# Altium footprint library AMDC.PcbLib: 96 footprints (part 3 of 6)
Each footprint in its own frame and in the unit in brackets; x right, y up, seen from the top. Pads: shape width x height; smd on the part's side, far side on the other; paste and mask are expansions set on the pad; w line width, h text height; cw(c..) or ccw(c..) is an arc to the next point about the centre after c.
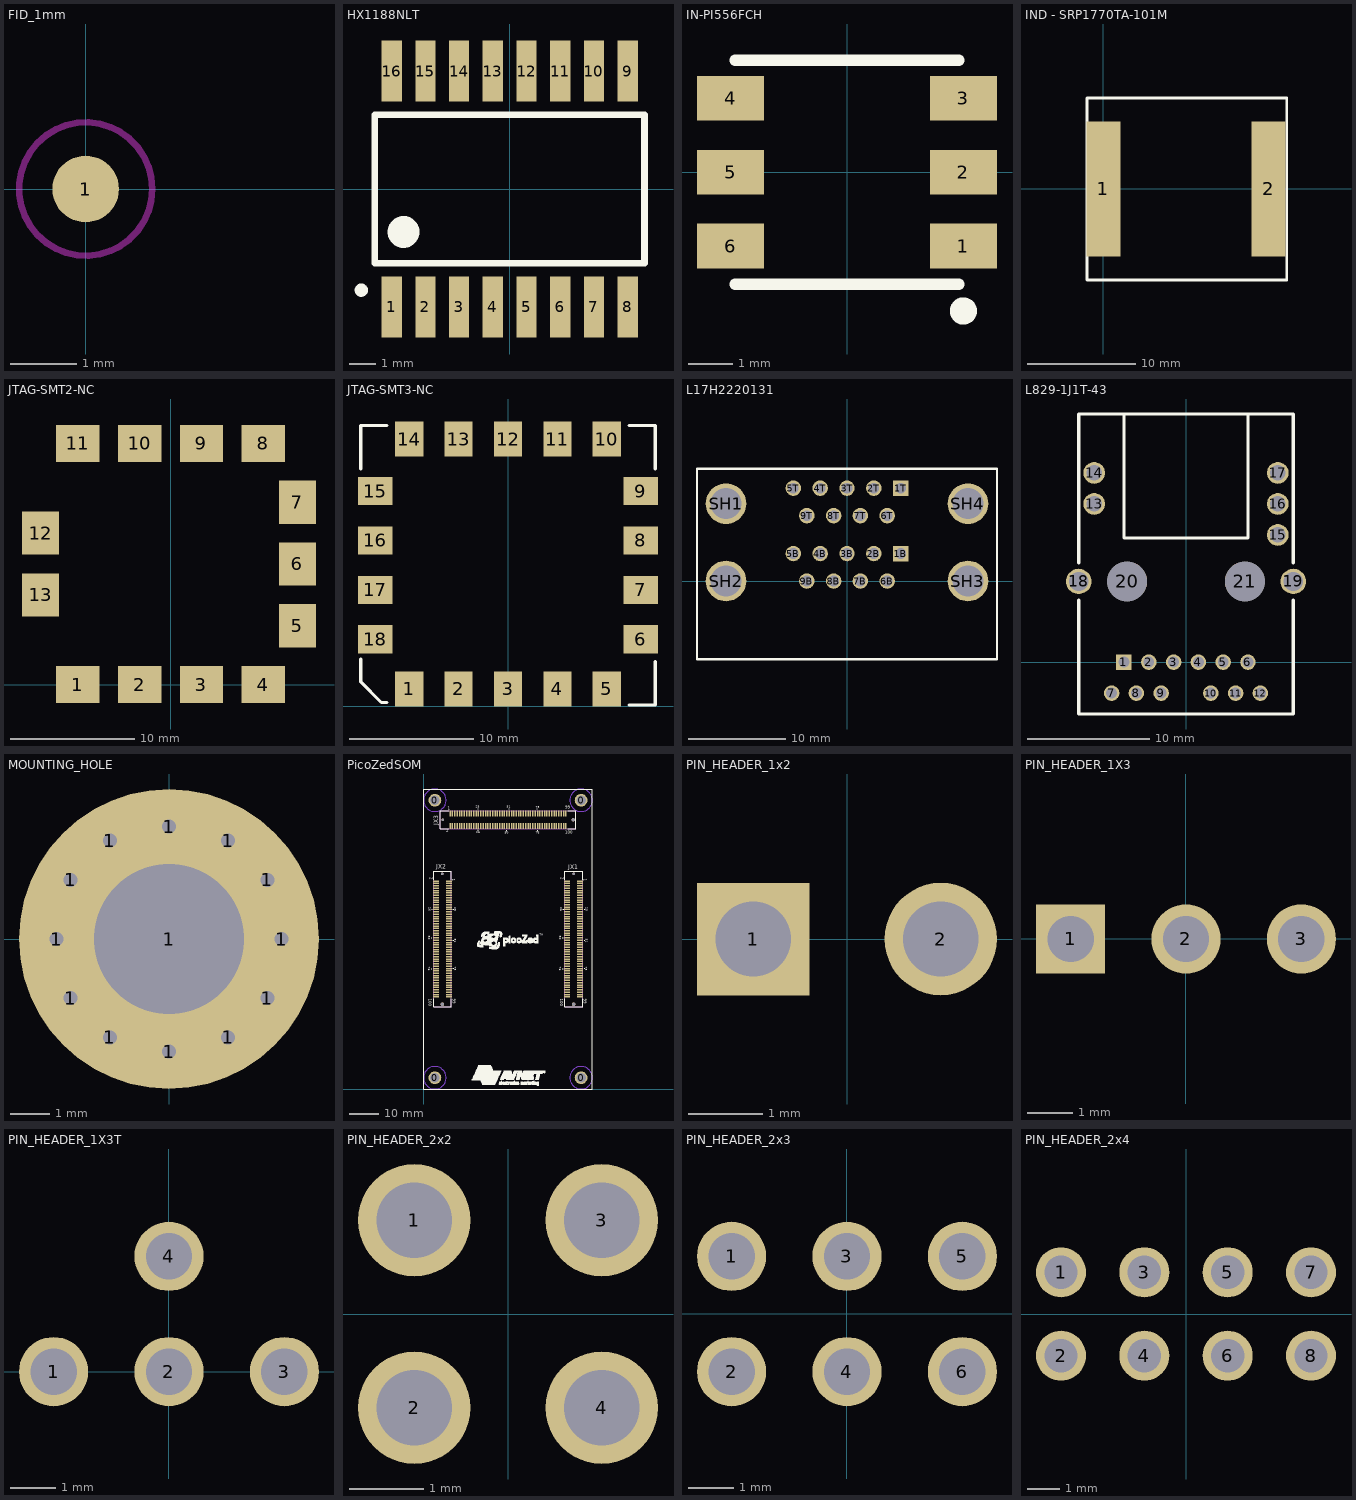
[diagram p2: the footprints below, top view; thin cyan lines are the x and y axes]

## FID_1mm [mm]
pads (1):
  round 1 smd mask+0.5: 1(0,0)
Top Layer:
  pour cut-out: 0,0
  pour cut-out: 3.5,0.5
Top Layer keep-out:
  circle w0.1: c0,0 r1

## HX1188NLT [mil] "XFRMR MAGNETIC 1PORT 1:1 10/100"
height 236
pads (16):
  rect 30x90 smd: 1(-175,-175) 2(-125,-175) 3(-75,-175) 4(-25,-175) 5(25,-175) 6(75,-175) 7(125,-175) 8(175,-175) 9(175,175) 10(125,175) 11(75,175) 12(25,175) 13(-25,175) 14(-75,175) 15(-125,175) 16(-175,175)
Top Overlay:
  circle w9.84: c-220,-150 r4.92
  circle w23.62: c-157.48,-63.62 r11.81
  lines w10: -200,-110 200,-110 200,110 -200,110 -200,-110
3D body "HX1188NL_3D.STEP": height 235, standoff 0, extent -250,-181.06 250,188.93

## IN-PI556FCH [mm] "LED RGB 5050 SMD"
pads (6):
  rect 1.5x1 smd: 1(2.6,-1.65) 2(2.6,0) 3(2.6,1.65) 4(-2.6,1.65) 5(-2.6,0) 6(-2.6,-1.65)
Top Overlay:
  circle w0.305: c2.6,-3.1 r0.152
  lines w0.254: -2.5,-2.5 2.5,-2.5 ; -2.5,2.5 2.5,2.5
3D body "APA102C.STEP": height 1.55, standoff 0, extent -2.75,-2.5 2.75,2.5

## IND - SRP1770TA-101M [mm] "FIXED IND 100UH 5.3A 118 MOHM"
pads (2):
  rect 3.15x12.5 smd: 1(0,0) 2(15.35,0)
Top Overlay:
  lines w0.254: -1.524,-8.45 17.018,-8.45 17.018,8.45 -1.524,8.45 -1.524,-8.382
3D body "SRP1770TA.stp": height 6.81, standoff 0, extent -1.27,-8.45 16.63,8.45

## JTAG-SMT2-NC [mm]
pads (13):
  rect 3.5x3 smd: 1(-7.5,0) 2(-2.5,0) 3(2.5,0) 4(7.5,0) 8(7.5,19.5) 9(2.5,19.5) 10(-2.5,19.5) 11(-7.5,19.5)
  rect 3x3.5 smd: 5(10.25,4.75) 6(10.25,9.75) 7(10.25,14.75) 12(-10.5,12.25) 13(-10.5,7.25)
3D body "SMT2-NC_1_0.stp": height 2.7, standoff 0, extent -11.25,-1 11.5,20.5

## JTAG-SMT3-NC [mm]
pads (18):
  rect 2.3x2.8 smd: 1(-8,1.4) 2(-4,1.4) 3(0,1.4) 4(4,1.4) 5(8,1.4) 10(8,21.6) 11(4,21.6) 12(0,21.6) 13(-4,21.6) 14(-8,21.6)
  rect 2.8x2.3 smd: 6(10.725,5.4) 7(10.725,9.4) 8(10.725,13.4) 9(10.725,17.4) 15(-10.725,17.4) 16(-10.725,13.4) 17(-10.725,9.4) 18(-10.725,5.4)
Top Overlay:
  lines w0.254: -11.9,3.8 -11.9,1.969 -10.231,0.3 -9.8,0.3 ; -11.9,19.2 -11.9,22.7 -9.8,22.7 ; 9.8,0.1 11.9,0.1 11.9,3.6 ; 9.8,22.7 11.9,22.7 11.9,19.2
3D body "DIGILENT_JTAG-SMT3.STEP": height 2.52, standoff 0.02, extent -11.331,0.685 11.419,22.185

## L17H2220131 [mm] "CONN D-SUB RCPT 9POS R/A SLDR"
pads (22):
  rect 1.6x1.6 hole 1.1: 1B(5.54,2.84) 1T(5.54,9.6)
  round 1.6 hole 1.1: 2B(2.77,2.84) 2T(2.77,9.6) 3B(0,2.84) 3T(0,9.6) 4B(-2.77,2.84) 4T(-2.77,9.6) 5B(-5.54,2.84) 5T(-5.54,9.6) 6B(4.155,0) 6T(4.155,6.76) 7B(1.385,0) 7T(1.385,6.76) 8B(-1.385,0) 8T(-1.385,6.76) 9B(-4.155,0) 9T(-4.155,6.76)
  round 4.2 hole 3.2: SH1(-12.5,8) SH2(-12.5,0) SH3(12.5,0) SH4(12.5,8)
Top Overlay:
  lines w0.254: -15.5,-8.08 -15.5,11.6 15.5,11.6 15.5,-8.08 -15.5,-8.08
3D body "L17H2220131--3DModel-STEP-56544.STEP": height 31.67, standoff -3.63, extent -15.405,-13.8 15.405,11.6

## L829-1J1T-43 [mil] "CONN MAGJACK 1PORT 1000 BASE-T"
height 440
pads (21):
  rect 50x50 hole 35.04: 1(-200,0)
  round 50 hole 35.04: 2(-120.08,0) 3(-40.08,0) 4(40,0) 5(119.92,0) 6(199.92,0) 7(-240,-100) 8(-160,-100) 9(-80,-100) 10(80,-100) 11(160,-100) 12(240,-100)
  round 70 hole 50: 13(-296,510) 14(-296,610) 15(296,410) 16(296,510) 17(296,610)
  round 82 hole 62: 18(-346,260) 19(346,260)
  round 127.95 hole 127.95: 20(-190,260) 21(190,260)
Top Overlay:
  pour cut-out: -80,400
  lines w10: -346,200 -346,-167.44 346,-167.44 346,200 ; -346,320 -346,800 -173,800 73,800 346,800 346,320 ; -200,800 -200,400 200,400 200,800
3D body "BEL FUSE L829-1J1T-43-1.step": height 493.47, standoff -151.51, extent -400.55,-167.44 400.55,799.56

## MOUNTING_HOLE [mil]
pads (13):
  round 30 hole 14: 1(-112.5,0) 1(-98.43,-59.06) 1(-98.43,59.06) 1(-59.06,-98.43) 1(-59.06,98.43) 1(0,-112.5) 1(0,112.5) 1(59.06,-98.43) 1(59.06,98.43) 1(98.43,-59.06) 1(98.43,59.06) 1(112.5,0)
  round 300 hole 150: 1(0,0)

## PicoZedSOM [mil] "PicoZed SOM Footprint"
pads (310):
  round 170 hole 125: 0(150,150) 0(150,3850) 0(2100,150) 0(2100,3850)
  round 45.98 hole 47.99 unplated: 0(250.5,1130) 0(1995,3590) 0(2000.5,1130)
  round 30 hole 32.01 unplated: 0(250.5,2870) 0(255,3590) 0(2000.5,2870)
  rect 80x20 smd: JX1-1(2087.11,2771.65) JX1-2(1913.89,2771.65) JX1-3(2087.11,2740.16) JX1-4(1913.89,2740.16) JX1-5(2087.11,2708.66) JX1-6(1913.89,2708.66) JX1-7(2087.11,2677.17) JX1-8(1913.89,2677.17) JX1-9(2087.11,2645.67) JX1-10(1913.89,2645.67) JX1-11(2087.11,2614.17) JX1-12(1913.89,2614.17) JX1-13(2087.11,2582.68) JX1-14(1913.89,2582.68) JX1-15(2087.11,2551.18) JX1-16(1913.89,2551.18) JX1-17(2087.11,2519.68) JX1-18(1913.89,2519.69) JX1-19(2087.11,2488.19) JX1-20(1913.89,2488.19) JX1-21(2087.11,2456.69) JX1-22(1913.89,2456.69) JX1-23(2087.11,2425.2) JX1-24(1913.89,2425.2) JX1-25(2087.11,2393.7) JX1-26(1913.89,2393.7) JX1-27(2087.11,2362.2) JX1-28(1913.89,2362.21) JX1-29(2087.11,2330.71) JX1-30(1913.89,2330.71) JX1-31(2087.11,2299.21) JX1-32(1913.89,2299.21) JX1-33(2087.11,2267.72) JX1-34(1913.89,2267.72) JX1-35(2087.11,2236.22) JX1-36(1913.89,2236.22) JX1-37(2087.11,2204.72) JX1-38(1913.89,2204.73) JX1-39(2087.11,2173.23) JX1-40(1913.89,2173.23) JX1-41(2087.11,2141.73) JX1-42(1913.89,2141.73) JX1-43(2087.11,2110.24) JX1-44(1913.89,2110.24) JX1-45(2087.11,2078.74) JX1-46(1913.89,2078.74) JX1-47(2087.11,2047.24) JX1-48(1913.89,2047.25) JX1-49(2087.11,2015.75) JX1-50(1913.89,2015.75) JX1-51(2087.11,1984.25) JX1-52(1913.89,1984.25) JX1-53(2087.11,1952.76) JX1-54(1913.89,1952.76) JX1-55(2087.11,1921.26) JX1-56(1913.89,1921.26) JX1-57(2087.11,1889.76) JX1-58(1913.89,1889.77) JX1-59(2087.11,1858.27) JX1-60(1913.89,1858.27) JX1-61(2087.11,1826.77) JX1-62(1913.89,1826.77) JX1-63(2087.11,1795.28) JX1-64(1913.89,1795.28) JX1-65(2087.11,1763.78) JX1-66(1913.89,1763.78) JX1-67(2087.11,1732.28) JX1-68(1913.89,1732.29) JX1-69(2087.11,1700.79) JX1-70(1913.89,1700.79) JX1-71(2087.11,1669.29) JX1-72(1913.89,1669.29) JX1-73(2087.11,1637.8) JX1-74(1913.89,1637.8) JX1-75(2087.11,1606.3) JX1-76(1913.89,1606.3) JX1-77(2087.11,1574.8) JX1-78(1913.89,1574.81) JX1-79(2087.11,1543.31) JX1-80(1913.89,1543.31) JX1-81(2087.11,1511.81) JX1-82(1913.89,1511.81) JX1-83(2087.11,1480.31) JX1-84(1913.89,1480.32) JX1-85(2087.11,1448.82) JX1-86(1913.89,1448.82) JX1-87(2087.11,1417.32) JX1-88(1913.89,1417.33) JX1-89(2087.11,1385.83) JX1-90(1913.89,1385.83) JX1-91(2087.11,1354.33) JX1-92(1913.89,1354.33) JX1-93(2087.11,1322.83) JX1-94(1913.89,1322.84) JX1-95(2087.11,1291.34) JX1-96(1913.89,1291.34) JX1-97(2087.11,1259.84) JX1-98(1913.89,1259.85) JX1-99(2087.11,1228.35) JX1-100(1913.89,1228.35) JX2-1(337.11,2771.65) JX2-2(163.89,2771.65) JX2-3(337.11,2740.16) JX2-4(163.89,2740.16) JX2-5(337.11,2708.66) JX2-6(163.89,2708.66) JX2-7(337.11,2677.17) JX2-8(163.89,2677.17) JX2-9(337.11,2645.67) JX2-10(163.89,2645.67) JX2-11(337.11,2614.17) JX2-12(163.89,2614.17) JX2-13(337.11,2582.68) JX2-14(163.89,2582.68) JX2-15(337.11,2551.18) JX2-16(163.89,2551.18) JX2-17(337.11,2519.68) JX2-18(163.89,2519.69) JX2-19(337.11,2488.19) JX2-20(163.89,2488.19) JX2-21(337.11,2456.69) JX2-22(163.89,2456.69) JX2-23(337.11,2425.2) JX2-24(163.89,2425.2) JX2-25(337.11,2393.7) JX2-26(163.89,2393.7) JX2-27(337.11,2362.2) JX2-28(163.89,2362.21) JX2-29(337.11,2330.71) JX2-30(163.89,2330.71) JX2-31(337.11,2299.21) JX2-32(163.89,2299.21) JX2-33(337.11,2267.72) JX2-34(163.89,2267.72) JX2-35(337.11,2236.22) JX2-36(163.89,2236.22) JX2-37(337.11,2204.72) JX2-38(163.89,2204.73) JX2-39(337.11,2173.23) JX2-40(163.89,2173.23) JX2-41(337.11,2141.73) JX2-42(163.89,2141.73) JX2-43(337.11,2110.24) JX2-44(163.89,2110.24) JX2-45(337.11,2078.74) JX2-46(163.89,2078.74) JX2-47(337.11,2047.24) JX2-48(163.89,2047.25) JX2-49(337.11,2015.75) JX2-50(163.89,2015.75) JX2-51(337.11,1984.25) JX2-52(163.89,1984.25) JX2-53(337.11,1952.76) JX2-54(163.89,1952.76) JX2-55(337.11,1921.26) JX2-56(163.89,1921.26) JX2-57(337.11,1889.76) JX2-58(163.89,1889.77) JX2-59(337.11,1858.27) JX2-60(163.89,1858.27) JX2-61(337.11,1826.77) JX2-62(163.89,1826.77) JX2-63(337.11,1795.28) JX2-64(163.89,1795.28) JX2-65(337.11,1763.78) JX2-66(163.89,1763.78) JX2-67(337.11,1732.28) JX2-68(163.89,1732.29) JX2-69(337.11,1700.79) JX2-70(163.89,1700.79) JX2-71(337.11,1669.29) JX2-72(163.89,1669.29) JX2-73(337.11,1637.8) JX2-74(163.89,1637.8) JX2-75(337.11,1606.3) JX2-76(163.89,1606.3) JX2-77(337.11,1574.8) JX2-78(163.89,1574.81) JX2-79(337.11,1543.31) JX2-80(163.89,1543.31) JX2-81(337.11,1511.81) JX2-82(163.89,1511.81) JX2-83(337.11,1480.31) JX2-84(163.89,1480.32) JX2-85(337.11,1448.82) JX2-86(163.89,1448.82) JX2-87(337.11,1417.32) JX2-88(163.89,1417.33) JX2-89(337.11,1385.83) JX2-90(163.89,1385.83) JX2-91(337.11,1354.33) JX2-92(163.89,1354.33) JX2-93(337.11,1322.83) JX2-94(163.89,1322.84) JX2-95(337.11,1291.34) JX2-96(163.89,1291.34) JX2-97(337.11,1259.84) JX2-98(163.89,1259.85) JX2-99(337.11,1228.35) JX2-100(163.89,1228.35)
  rect 20x80 smd: JX3-1(353.35,3676.61) JX3-2(353.35,3503.39) JX3-3(384.84,3676.61) JX3-4(384.84,3503.39) JX3-5(416.34,3676.61) JX3-6(416.34,3503.39) JX3-7(447.83,3676.61) JX3-8(447.83,3503.39) JX3-9(479.33,3676.61) JX3-10(479.33,3503.39) JX3-11(510.83,3676.61) JX3-12(510.83,3503.39) JX3-13(542.32,3676.61) JX3-14(542.32,3503.39) JX3-15(573.82,3676.61) JX3-16(573.82,3503.39) JX3-17(605.32,3676.61) JX3-18(605.31,3503.39) JX3-19(636.81,3676.61) JX3-20(636.81,3503.39) JX3-21(668.31,3676.61) JX3-22(668.31,3503.39) JX3-23(699.8,3676.61) JX3-24(699.8,3503.39) JX3-25(731.3,3676.61) JX3-26(731.3,3503.39) JX3-27(762.8,3676.61) JX3-28(762.79,3503.39) JX3-29(794.29,3676.61) JX3-30(794.29,3503.39) JX3-31(825.79,3676.61) JX3-32(825.79,3503.39) JX3-33(857.28,3676.61) JX3-34(857.28,3503.39) JX3-35(888.78,3676.61) JX3-36(888.78,3503.39) JX3-37(920.28,3676.61) JX3-38(920.27,3503.39) JX3-39(951.77,3676.61) JX3-40(951.77,3503.39) JX3-41(983.27,3676.61) JX3-42(983.27,3503.39) JX3-43(1014.76,3676.61) JX3-44(1014.76,3503.39) JX3-45(1046.26,3676.61) JX3-46(1046.26,3503.39) JX3-47(1077.76,3676.61) JX3-48(1077.75,3503.39) JX3-49(1109.25,3676.61) JX3-50(1109.25,3503.39) JX3-51(1140.75,3676.61) JX3-52(1140.75,3503.39) JX3-53(1172.24,3676.61) JX3-54(1172.24,3503.39) JX3-55(1203.74,3676.61) JX3-56(1203.74,3503.39) JX3-57(1235.24,3676.61) JX3-58(1235.23,3503.39) JX3-59(1266.73,3676.61) JX3-60(1266.73,3503.39) JX3-61(1298.23,3676.61) JX3-62(1298.23,3503.39) JX3-63(1329.72,3676.61) JX3-64(1329.72,3503.39) JX3-65(1361.22,3676.61) JX3-66(1361.22,3503.39) JX3-67(1392.72,3676.61) JX3-68(1392.71,3503.39) JX3-69(1424.21,3676.61) JX3-70(1424.21,3503.39) JX3-71(1455.71,3676.61) JX3-72(1455.71,3503.39) JX3-73(1487.2,3676.61) JX3-74(1487.2,3503.39) JX3-75(1518.7,3676.61) JX3-76(1518.7,3503.39) JX3-77(1550.2,3676.61) JX3-78(1550.19,3503.39) JX3-79(1581.69,3676.61) JX3-80(1581.69,3503.39) JX3-81(1613.19,3676.61) JX3-82(1613.19,3503.39) JX3-83(1644.69,3676.61) JX3-84(1644.68,3503.39) JX3-85(1676.18,3676.61) JX3-86(1676.18,3503.39) JX3-87(1707.68,3676.61) JX3-88(1707.67,3503.39) JX3-89(1739.17,3676.61) JX3-90(1739.17,3503.39) JX3-91(1770.67,3676.61) JX3-92(1770.67,3503.39) JX3-93(1802.17,3676.61) JX3-94(1802.16,3503.39) JX3-95(1833.66,3676.61) JX3-96(1833.66,3503.39) JX3-97(1865.16,3676.61) JX3-98(1865.15,3503.39) JX3-99(1896.65,3676.61) JX3-100(1896.65,3503.39)
Top Layer keep-out:
  circle w4: c2100,150 r150
  circle w4: c150,3850 r150
  circle w4: c2100,3850 r150
  circle w4: c150,150 r150
Bottom Layer keep-out:
  circle w4: c2100,150 r150
  circle w4: c150,3850 r150
  circle w4: c2100,3850 r150
  circle w4: c150,150 r150
Top Overlay:
  drawing of 6065 lines, arcs and shapes, not listed
  text "JX3" at 192,3516.5 h60
  text "100" at 1885,3401.5 h40
  text "99" at 1888,3736.5 h40
  text "2" at 304,3420.01 h40
  text "1" at 323,3723.01 h40
  text "25" at 696.58,3750.99 h30
  text "26" at 703.58,3410.99 h30
  text "51" at 1111.58,3750.99 h30
  text "75" at 1493.58,3745.99 h30
  text "76" at 1493.58,3400.99 h30
  text "50" at 1083.58,3400.99 h30
  text "50" at 1811.49,2041.42 h30
  text "76" at 1811.49,1631.42 h30
  text "75" at 2156.49,1631.42 h30
  text "51" at 2161.49,2006.42 h30
  text "26" at 1821.49,2421.42 h30
  text "25" at 2161.49,2421.42 h30
  text "1" at 2133.51,2802 h40
  text "2" at 1830.51,2821 h40
  text "99" at 2136.49,1201.42 h40
  text "100" at 1821.49,1201.42 h40
  text "100" at 71.49,1201.42 h40
  text "99" at 386.49,1201.42 h40
  text "2" at 80.51,2821 h40
  text "1" at 383.51,2802 h40
  text "25" at 411.49,2421.42 h30
  text "26" at 71.49,2421.42 h30
  text "51" at 411.49,2006.42 h30
  text "75" at 406.49,1631.42 h30
  text "76" at 61.49,1631.42 h30
  text "50" at 61.49,2041.42 h30
  text "JX2" at 170,2937 h60
  text "JX1" at 1927,2933 h60
  text "TM" at 1551,2040.5 h15
Mechanical 12:
  lines w10: 140,150 160,150 ; 140,3850 160,3850 ; 150,140 150,160 ; 150,3840 150,3860 ; 240.5,1130 260.5,1130 ; 240.5,2870 260.5,2870 ; 245,3590 265,3590 ; 250.5,1120 250.5,1140 ; 250.5,2860 250.5,2880 ; 255,3580 255,3600 ; 1985,3590 2005,3590 ; 1990.5,1130 2010.5,1130 ; 1990.5,2870 2010.5,2870 ; 1995,3580 1995,3600 ; 2000.5,1120 2000.5,1140 ; 2000.5,2860 2000.5,2880 ; 2090,150 2110,150 ; 2090,3850 2110,3850 ; 2100,140 2100,160 ; 2100,3840 2100,3860
Mechanical 13:
  lines w6: 132.39,1098.42 368.61,1098.42 368.61,2901.57 132.39,2901.57 132.39,1098.42 ; 223.43,3471.89 223.43,3708.11 2026.58,3708.11 2026.58,3471.89 223.43,3471.89 ; 1882.39,1098.42 1882.39,2901.57 2118.61,2901.57 2118.61,1098.42 1882.39,1098.42
3D body "s61083-101x0xxx.stp": height 185.64, standoff -24.99, extent 224,3471.5 2027.15,3707.72
3D body "s61083-101x0xxx.stp": height 185.64, standoff -24.99, extent 1882,1097.85 2118.22,2901
3D body "s61083-101x0xxx.stp": height 183.07, standoff -27.56, extent 131.9,1099.43 368.12,2902.57
3D body: height 1, standoff 0, extent 2100.43,0.22 2250.43,300.22
3D body: height 1, standoff 0, extent 1950.43,0.22 2100.43,300.22
3D body: height 1, standoff 0, extent 150.43,3700.22 300.43,4000.22
3D body: height 1, standoff 0, extent 0.43,3700.22 150.43,4000.22
3D body: height 1, standoff 0, extent 2099.43,3700.22 2249.43,4000.22
3D body: height 1, standoff 0, extent 1949.43,3700.22 2099.43,4000.22
3D body: height 1, standoff 0, extent 149.43,0.22 299.43,300.22
3D body: height 1, standoff 0, extent -0.57,0.22 149.43,300.22

## PIN_HEADER_1x2 [mil]
pads (2):
  rect 60x60 hole 40.16: 1(-50,0)
  round 60 hole 40.16: 2(50,0)

## PIN_HEADER_1X3 [mil]
pads (3):
  rect 60x60 hole 40.16: 1(-100,0)
  round 60 hole 40.16: 2(0,0) 3(100,0)

## PIN_HEADER_1X3T [mil]
pads (4):
  round 60 hole 40.16: 1(-100,0) 2(0,0) 3(100,0) 4(0,100)

## PIN_HEADER_2x2 [mil]
pads (4):
  round 60 hole 40.16: 1(-50,50) 2(-50,-50) 3(50,50) 4(50,-50)

## PIN_HEADER_2x3 [mil]
pads (6):
  round 60 hole 40.16: 1(-100,50) 2(-100,-50) 3(0,50) 4(0,-50) 5(100,50) 6(100,-50)

## PIN_HEADER_2x4 [mil]
pads (8):
  round 60 hole 40.16: 1(-150,50) 2(-150,-50) 3(-50,50) 4(-50,-50) 5(50,50) 6(50,-50) 7(150,50) 8(150,-50)